# Altium schematic symbol library Capacitor - Aluminium TH.SchLib: 4591 symbols (part 1 of 27) (continued)
## 10YXG2200MEFC12.5X20 (continued)
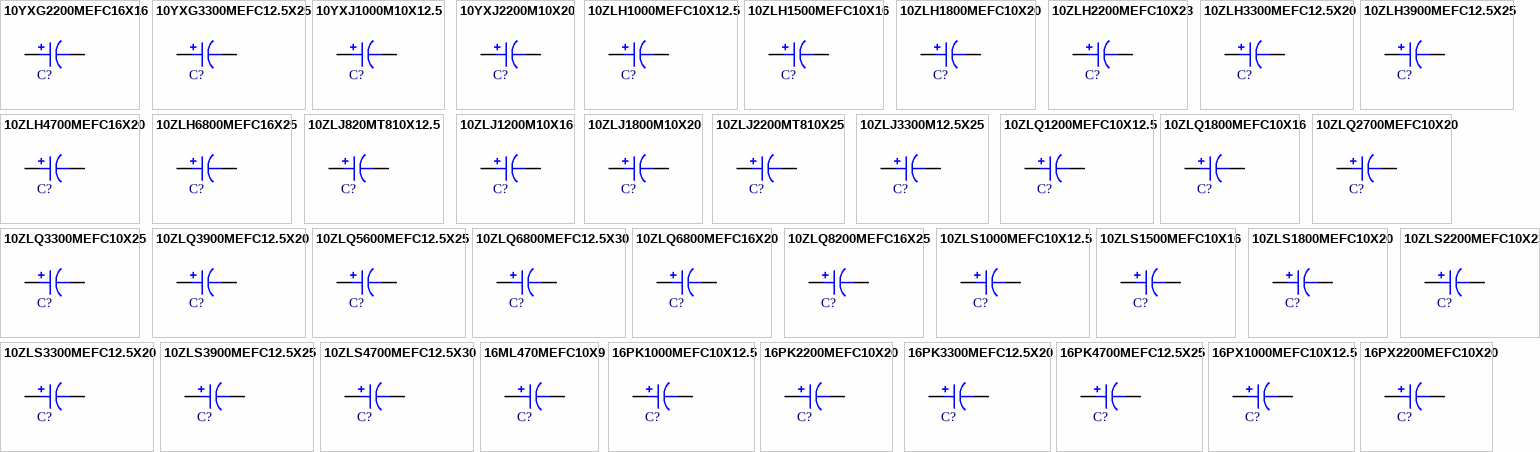
[diagram p1: symbols 10YXG2200MEFC16X16 to 16PX2200MEFC10X20]

## 10YXG2200MEFC16X16
designator C?, comment 2200uF  (value not drawn)
CAP ALUM 2200UF 20% 10V RADIAL; Part Number: 10YXG2200MEFC16X16; Manufacturer: Rubycon; TemperatureRange: -40C ~ 105C; Type: Polar; Ripple Current: 1.358A @ 120Hz; Impedance: 42 mOhm; Value: 2200uF; PartId: 26285; Supplier 1: Digi-Key; Supplier Part Number 1: 1189-1062-ND; ComponentLink1Description: Datasheet; ComponentLink1URL: http://www.rubycon.co.jp/en/catalog/e_pdfs/aluminum/e_yxg.pdf; ComponentLink2Description: Digi-Key Listing; ComponentLink2URL: https://www.digikey.com/product-detail/en/rubycon/10YXG2200MEFC16X16/1189-1062-ND/3133999; Tolerance: 20%; Voltage: 10V; Price: 1.01; Device Package: Radial, Can, 16mm
footprint CAP AL TH D16 L7.5 H20
pins: 1, 2

## 10YXG3300MEFC12.5X25
designator C?, comment 3300uF  (value not drawn)
CAP ALUM 3300UF 20% 10V RADIAL; Part Number: 10YXG3300MEFC12.5X25; Manufacturer: Rubycon; TemperatureRange: -40C ~ 105C; Type: Polar; Ripple Current: 1.561A @ 120Hz; Impedance: 27 mOhm; Value: 3300uF; PartId: 23909; Supplier 1: Digi-Key; Supplier Part Number 1: 1189-1714-ND; ComponentLink1Description: Datasheet; ComponentLink1URL: http://www.rubycon.co.jp/en/catalog/e_pdfs/aluminum/e_yxg.pdf; ComponentLink2Description: Digi-Key Listing; ComponentLink2URL: https://www.digikey.com/product-detail/en/rubycon/10YXG3300MEFC12.5X25/1189-1714-ND/3564118; Tolerance: 20%; Voltage: 10V; Price: 0.91; Device Package: Radial, Can, 12.5mm
footprint CAP AL TH D12.5 L5 H27
pins: 1, 2

## 10YXJ1000M10X12.5
designator C?, comment 1000uF  (value not drawn)
CAP ALUM 1000UF 20% 10V RADIAL; Part Number: 10YXJ1000M10X12.5; Manufacturer: Rubycon; TemperatureRange: -40C ~ 105C; Type: Polar; Ripple Current: 865mA; Impedance: 80 mOhm; Value: 1000uF; PartId: 24938; Supplier 1: Digi-Key; Supplier Part Number 1: 1189-1067-ND; ComponentLink1Description: Datasheet; ComponentLink1URL: http://www.rubycon.co.jp/en/catalog/e_pdfs/aluminum/e_yxj.pdf; ComponentLink2Description: Digi-Key Listing; ComponentLink2URL: https://www.digikey.com/product-detail/en/rubycon/10YXJ1000M10X12.5/1189-1067-ND/3134007; Tolerance: 20%; Voltage: 10V; Price: 0.51; Device Package: Radial, Can, 10mm
footprint CAP AL TH D10 L5 H14.5
pins: 1, 2

## 10YXJ2200M10X20
designator C?, comment 2200uF  (value not drawn)
CAP ALUM 2200UF 20% 10V RADIAL; Part Number: 10YXJ2200M10X20; Manufacturer: Rubycon; TemperatureRange: -40C ~ 105C; Type: Polar; Ripple Current: 1.4A; Impedance: 46 mOhm; Value: 2200uF; PartId: 25839; Supplier 1: Digi-Key; Supplier Part Number 1: 1189-1068-ND; ComponentLink1Description: Datasheet; ComponentLink1URL: http://www.rubycon.co.jp/en/catalog/e_pdfs/aluminum/e_yxj.pdf; ComponentLink2Description: Digi-Key Listing; ComponentLink2URL: https://www.digikey.com/product-detail/en/rubycon/10YXJ2200M10X20/1189-1068-ND/3134009; Tolerance: 20%; Voltage: 10V; Price: 0.48; Device Package: Radial, Can, 10mm
footprint CAP AL TH D10 L5 H22
pins: 1, 2

## 10ZLH1000MEFC10X12.5
designator C?, comment 1000uF  (value not drawn)
CAP ALUM 1000UF 20% 10V RADIAL; Part Number: 10ZLH1000MEFC10X12.5; Manufacturer: Rubycon; TemperatureRange: -40C ~ 105C; Type: Polar; Ripple Current: 798mA; Impedance: 39 mOhm; Value: 1000uF; PartId: 24901; Supplier 1: Digi-Key; Supplier Part Number 1: 1189-1072-ND; ComponentLink1Description: Datasheet; ComponentLink1URL: http://www.rubycon.co.jp/en/catalog/e_pdfs/aluminum/e_zlh.pdf; ComponentLink2Description: Digi-Key Listing; ComponentLink2URL: https://www.digikey.com/product-detail/en/rubycon/10ZLH1000MEFC10X12.5/1189-1072-ND/3134015; Tolerance: 20%; Voltage: 10V; Price: 0.49; Device Package: Radial, Can, 10mm
footprint CAP AL TH D10 L5 H14.5
pins: 1, 2

## 10ZLH1500MEFC10X16
designator C?, comment 1500uF  (value not drawn)
CAP ALUM 1500UF 20% 10V RADIAL; Part Number: 10ZLH1500MEFC10X16; Manufacturer: Rubycon; TemperatureRange: -40C ~ 105C; Type: Polar; Ripple Current: 1.056A; Impedance: 28 mOhm; Value: 1500uF; PartId: 25279; Supplier 1: Digi-Key; Supplier Part Number 1: 1189-1074-ND; ComponentLink1Description: Datasheet; ComponentLink1URL: http://www.rubycon.co.jp/en/catalog/e_pdfs/aluminum/e_zlh.pdf; ComponentLink2Description: Digi-Key Listing; ComponentLink2URL: https://www.digikey.com/product-detail/en/rubycon/10ZLH1500MEFC10X16/1189-1074-ND/3134018; Tolerance: 20%; Voltage: 10V; Price: 0.62; Device Package: Radial, Can, 10mm
footprint CAP AL TH D10 L5 H17.5
pins: 1, 2

## 10ZLH1800MEFC10X20
designator C?, comment 1800uF  (value not drawn)
CAP ALUM 1800UF 20% 10V RADIAL; Part Number: 10ZLH1800MEFC10X20; Manufacturer: Rubycon; TemperatureRange: -40C ~ 105C; Type: Polar; Ripple Current: 1.176A; Impedance: 20 mOhm; Value: 1800uF; PartId: 25915; Supplier 1: Digi-Key; Supplier Part Number 1: 1189-2951-ND; ComponentLink1Description: Datasheet; ComponentLink1URL: http://www.rubycon.co.jp/en/catalog/e_pdfs/aluminum/e_zlh.pdf; ComponentLink2Description: Digi-Key Listing; ComponentLink2URL: https://www.digikey.com/product-detail/en/rubycon/10ZLH1800MEFC10X20/1189-2951-ND/3563822; Tolerance: 20%; Voltage: 10V; Price: 0.7; Device Package: Radial, Can, 10mm
footprint CAP AL TH D10 L5 H22
pins: 1, 2

## 10ZLH2200MEFC10X23
designator C?, comment 2200uF  (value not drawn)
CAP ALUM 2200UF 20% 10V RADIAL; Part Number: 10ZLH2200MEFC10X23; Manufacturer: Rubycon; TemperatureRange: -40C ~ 105C; Type: Polar; Ripple Current: 1.575A; Impedance: 18 mOhm; Value: 2200uF; PartId: 26129; Supplier 1: Digi-Key; Supplier Part Number 1: 1189-2172-ND; ComponentLink1Description: Datasheet; ComponentLink1URL: http://www.rubycon.co.jp/en/catalog/e_pdfs/aluminum/e_zlh.pdf; ComponentLink2Description: Digi-Key Listing; ComponentLink2URL: https://www.digikey.com/product-detail/en/rubycon/10ZLH2200MEFC10X23/1189-2172-ND/3563866; Tolerance: 20%; Voltage: 10V; Price: 0.8; Device Package: Radial, Can, 10mm
footprint CAP AL TH D10 L5 H30
pins: 1, 2

## 10ZLH3300MEFC12.5X20
designator C?, comment 3300uF  (value not drawn)
CAP ALUM 3300UF 20% 10V RADIAL; Part Number: 10ZLH3300MEFC12.5X20; Manufacturer: Rubycon; TemperatureRange: -40C ~ 105C; Type: Polar; Ripple Current: 1.736A; Impedance: 17 mOhm; Value: 3300uF; PartId: 23453; Supplier 1: Digi-Key; Supplier Part Number 1: 1189-2173-ND; ComponentLink1Description: Datasheet; ComponentLink1URL: http://www.rubycon.co.jp/en/catalog/e_pdfs/aluminum/e_zlh.pdf; ComponentLink2Description: Digi-Key Listing; ComponentLink2URL: https://www.digikey.com/product-detail/en/rubycon/10ZLH3300MEFC12.5X20/1189-2173-ND/3564062; Tolerance: 20%; Voltage: 10V; Price: 1.04; Device Package: Radial, Can, 12.5mm
footprint CAP AL TH D12.5 L5 H22
pins: 1, 2

## 10ZLH3900MEFC12.5X25
designator C?, comment 3900uF  (value not drawn)
CAP ALUM 3900UF 20% 10V RADIAL; Part Number: 10ZLH3900MEFC12.5X25; Manufacturer: Rubycon; TemperatureRange: -40C ~ 105C; Type: Polar; Ripple Current: 2.03A; Impedance: 15 mOhm; Value: 3900uF; PartId: 24002; Supplier 1: Digi-Key; Supplier Part Number 1: 1189-2952-ND; ComponentLink1Description: Datasheet; ComponentLink1URL: http://www.rubycon.co.jp/en/catalog/e_pdfs/aluminum/e_zlh.pdf; ComponentLink2Description: Digi-Key Listing; ComponentLink2URL: https://www.digikey.com/product-detail/en/rubycon/10ZLH3900MEFC12.5X25/1189-2952-ND/3564147; Tolerance: 20%; Voltage: 10V; Price: 1.05; Device Package: Radial, Can, 12.5mm
footprint CAP AL TH D12.5 L5 H27
pins: 1, 2

## 10ZLH4700MEFC16X20
designator C?, comment 4700uF  (value not drawn)
CAP ALUM 4700UF 20% 10V RADIAL; Part Number: 10ZLH4700MEFC16X20; Manufacturer: Rubycon; TemperatureRange: -40C ~ 105C; Type: Polar; Ripple Current: 2.275A; Impedance: 15 mOhm; Value: 4700uF; PartId: 26421; Supplier 1: Digi-Key; Supplier Part Number 1: 1189-2954-ND; ComponentLink1Description: Datasheet; ComponentLink1URL: http://www.rubycon.co.jp/en/catalog/e_pdfs/aluminum/e_zlh.pdf; ComponentLink2Description: Digi-Key Listing; ComponentLink2URL: https://www.digikey.com/product-detail/en/rubycon/10ZLH4700MEFC16X20/1189-2954-ND/3564405; Tolerance: 20%; Voltage: 10V; Price: 1.24; Device Package: Radial, Can, 16mm
footprint CAP AL TH D16 L7.5 H22
pins: 1, 2

## 10ZLH6800MEFC16X25
designator C?, comment 6800uF  (value not drawn)
CAP ALUM 6800UF 20% 10V RADIAL; Part Number: 10ZLH6800MEFC16X25; Manufacturer: Rubycon; TemperatureRange: -40C ~ 105C; Type: Polar; Ripple Current: 2.541A; Impedance: 13 mOhm; Value: 6800uF; PartId: 26892; Supplier 1: Digi-Key; Supplier Part Number 1: 1189-2956-ND; ComponentLink1Description: Datasheet; ComponentLink1URL: http://www.rubycon.co.jp/en/catalog/e_pdfs/aluminum/e_zlh.pdf; ComponentLink2Description: Digi-Key Listing; ComponentLink2URL: https://www.digikey.com/product-detail/en/rubycon/10ZLH6800MEFC16X25/1189-2956-ND/3564489; Tolerance: 20%; Voltage: 10V; Price: 1.4; Device Package: Radial, Can, 16mm
footprint CAP AL TH D16 L7.5 H27
pins: 1, 2

## 10ZLJ820MT810X12.5
designator C?, comment 820uF  (value not drawn)
CAP ALUM 820UF 20% 10V RADIAL; Part Number: 10ZLJ820MT810X12.5; Manufacturer: Rubycon; TemperatureRange: -40C ~ 105C; Type: Polar; Ripple Current: 1.02A @ 120Hz; Impedance: 53 mOhm; Value: 820uF; PartId: 24601; Supplier 1: Digi-Key; Supplier Part Number 1: 1189-1530-2-ND; ComponentLink1Description: Datasheet; ComponentLink1URL: http://www.rubycon.co.jp/en/catalog/e_pdfs/aluminum/e_zlj.pdf; ComponentLink2Description: Digi-Key Listing; ComponentLink2URL: https://www.digikey.com/product-detail/en/rubycon/10ZLJ820MT810X12.5/1189-1530-2-ND/3134810; Tolerance: 20%; Voltage: 10V; Price: 0.1772; Device Package: Radial, Can, 10mm
footprint CAP AL TH D10 L5 H14.5
pins: 1, 2

## 10ZLJ1200M10X16
designator C?, comment 1200uF  (value not drawn)
CAP ALUM 1200UF 20% 10V RADIAL; Part Number: 10ZLJ1200M10X16; Manufacturer: Rubycon; TemperatureRange: -40C ~ 105C; Type: Polar; Ripple Current: 1.2A @ 120Hz; Impedance: 38 mOhm; Value: 1200uF; PartId: 25350; Supplier 1: Digi-Key; Supplier Part Number 1: 1189-1077-ND; ComponentLink1Description: Datasheet; ComponentLink1URL: http://www.rubycon.co.jp/en/catalog/e_pdfs/aluminum/e_zlj.pdf; ComponentLink2Description: Digi-Key Listing; ComponentLink2URL: https://www.digikey.com/product-detail/en/rubycon/10ZLJ1200M10X16/1189-1077-ND/3134023; Tolerance: 20%; Voltage: 10V; Price: 0.68; Device Package: Radial, Can, 10mm
footprint CAP AL TH D10 L5 H17.5
pins: 1, 2

## 10ZLJ1800M10X20
designator C?, comment 1800uF  (value not drawn)
CAP ALUM 1800UF 20% 10V RADIAL; Part Number: 10ZLJ1800M10X20; Manufacturer: Rubycon; TemperatureRange: -40C ~ 105C; Type: Polar; Ripple Current: 1.5A @ 120Hz; Impedance: 28 mOhm; Value: 1800uF; PartId: 25930; Supplier 1: Digi-Key; Supplier Part Number 1: 1189-2175-ND; ComponentLink1Description: Datasheet; ComponentLink1URL: http://www.rubycon.co.jp/en/catalog/e_pdfs/aluminum/e_zlj.pdf; ComponentLink2Description: Digi-Key Listing; ComponentLink2URL: https://www.digikey.com/product-detail/en/rubycon/10ZLJ1800M10X20/1189-2175-ND/3563826; Tolerance: 20%; Voltage: 10V; Price: 0.73; Device Package: Radial, Can, 10mm
footprint CAP AL TH D10 L5 H22
pins: 1, 2

## 10ZLJ2200MT810X25
designator C?, comment 2200uF  (value not drawn)
CAP ALUM 2200UF 20% 10V RADIAL; Part Number: 10ZLJ2200MT810X25; Manufacturer: Rubycon; TemperatureRange: -40C ~ 105C; Type: Polar; Ripple Current: 2.03A @ 120Hz; Impedance: 24 mOhm; Value: 2200uF; PartId: 26015; Supplier 1: Digi-Key; Supplier Part Number 1: 1189-1529-3-ND; ComponentLink1Description: Datasheet; ComponentLink1URL: http://www.rubycon.co.jp/en/catalog/e_pdfs/aluminum/e_zlj.pdf; ComponentLink2Description: Digi-Key Listing; ComponentLink2URL: https://www.digikey.com/product-detail/en/rubycon/10ZLJ2200MT810X25/1189-1529-3-ND/3134809; Tolerance: 20%; Voltage: 10V; Price: 0.3085; Device Package: Radial, Can, 10mm
footprint CAP AL TH D10 L5 H30
pins: 1, 2

## 10ZLJ3300M12.5X25
designator C?, comment 3300uF  (value not drawn)
CAP ALUM 3300UF 20% 10V RADIAL; Part Number: 10ZLJ3300M12.5X25; Manufacturer: Rubycon; TemperatureRange: -40C ~ 105C; Type: Polar; Ripple Current: 2.24A @ 120Hz; Impedance: 19 mOhm; Value: 3300uF; PartId: 24046; Supplier 1: Digi-Key; Supplier Part Number 1: 1189-2176-ND; ComponentLink1Description: Datasheet; ComponentLink1URL: http://www.rubycon.co.jp/en/catalog/e_pdfs/aluminum/e_zlj.pdf; ComponentLink2Description: Digi-Key Listing; ComponentLink2URL: https://www.digikey.com/product-detail/en/rubycon/10ZLJ3300M12.5X25/1189-2176-ND/3564154; Tolerance: 20%; Voltage: 10V; Price: 1.14; Device Package: Radial, Can, 12.5mm
footprint CAP AL TH D12.5 L5 H27
pins: 1, 2

## 10ZLQ1200MEFC10X12.5
designator C?, comment 1200uF  (value not drawn)
CAP ALUM 1200UF 20% 10V T/H; Part Number: 10ZLQ1200MEFC10X12.5; Manufacturer: Rubycon; TemperatureRange: -40C ~ 105C; Type: Polar; Ripple Current: 882mA @ 120Hz; Impedance: 35 mOhm; Value: 1200uF; PartId: 24980; Supplier 1: Digi-Key; Supplier Part Number 1: 1189-3615-ND; ComponentLink1Description: Datasheet; ComponentLink1URL: http://www.rubycon.co.jp/en/catalog/e_pdfs/aluminum/e_ZLQ.pdf; ComponentLink2Description: Digi-Key Listing; ComponentLink2URL: https://www.digikey.com/product-detail/en/rubycon/10ZLQ1200MEFC10X12.5/1189-3615-ND/6049862; Tolerance: 20%; Voltage: 10V; Price: 0.54; Device Package: Radial, Can, 10mm
footprint CAP AL TH D10 L5 H14.5
pins: 1, 2

## 10ZLQ1800MEFC10X16
designator C?, comment 1800uF  (value not drawn)
CAP ALUM 1800UF 20% 10V T/H; Part Number: 10ZLQ1800MEFC10X16; Manufacturer: Rubycon; TemperatureRange: -40C ~ 105C; Type: Polar; Ripple Current: 1.158A @ 120Hz; Impedance: 25 mOhm; Value: 1800uF; PartId: 25444; Supplier 1: Digi-Key; Supplier Part Number 1: 1189-3617-ND; ComponentLink1Description: Datasheet; ComponentLink1URL: http://www.rubycon.co.jp/en/catalog/e_pdfs/aluminum/e_ZLQ.pdf; ComponentLink2Description: Digi-Key Listing; ComponentLink2URL: https://www.digikey.com/product-detail/en/rubycon/10ZLQ1800MEFC10X16/1189-3617-ND/6049864; Tolerance: 20%; Voltage: 10V; Price: 0.66; Device Package: Radial, Can, 10mm
footprint CAP AL TH D10 L5 H17.5
pins: 1, 2

## 10ZLQ2700MEFC10X20
designator C?, comment 2700uF  (value not drawn)
CAP ALUM 2700UF 20% 10V T/H; Part Number: 10ZLQ2700MEFC10X20; Manufacturer: Rubycon; TemperatureRange: -40C ~ 105C; Type: Polar; Ripple Current: 1.491A @ 120Hz; Impedance: 18 mOhm; Value: 2700uF; PartId: 25897; Supplier 1: Digi-Key; Supplier Part Number 1: 1189-3618-ND; ComponentLink1Description: Datasheet; ComponentLink1URL: http://www.rubycon.co.jp/en/catalog/e_pdfs/aluminum/e_ZLQ.pdf; ComponentLink2Description: Digi-Key Listing; ComponentLink2URL: https://www.digikey.com/product-detail/en/rubycon/10ZLQ2700MEFC10X20/1189-3618-ND/6049865; Tolerance: 20%; Voltage: 10V; Price: 0.67; Device Package: Radial, Can, 10mm
footprint CAP AL TH D10 L5 H22
pins: 1, 2

## 10ZLQ3300MEFC10X25
designator C?, comment 3300uF  (value not drawn)
CAP ALUM 3300UF 20% 10V T/H; Part Number: 10ZLQ3300MEFC10X25; Manufacturer: Rubycon; TemperatureRange: -40C ~ 105C; Type: Polar; Ripple Current: 1.75A @ 120Hz; Impedance: 15 mOhm; Value: 3300uF; PartId: 26149; Supplier 1: Digi-Key; Supplier Part Number 1: 1189-3619-ND; ComponentLink1Description: Datasheet; ComponentLink1URL: http://www.rubycon.co.jp/en/catalog/e_pdfs/aluminum/e_ZLQ.pdf; ComponentLink2Description: Digi-Key Listing; ComponentLink2URL: https://www.digikey.com/product-detail/en/rubycon/10ZLQ3300MEFC10X25/1189-3619-ND/6049998; Tolerance: 20%; Voltage: 10V; Price: 0.84; Device Package: Radial, Can, 10mm
footprint CAP AL TH D10 L5 H30
pins: 1, 2

## 10ZLQ3900MEFC12.5X20
designator C?, comment 3900uF  (value not drawn)
CAP ALUM 3900UF 20% 10V T/H; Part Number: 10ZLQ3900MEFC12.5X20; Manufacturer: Rubycon; TemperatureRange: -40C ~ 105C; Type: Polar; Ripple Current: 1.883A @ 120Hz; Impedance: 16 mOhm; Value: 3900uF; PartId: 23399; Supplier 1: Digi-Key; Supplier Part Number 1: 1189-3620-ND; ComponentLink1Description: Datasheet; ComponentLink1URL: http://www.rubycon.co.jp/en/catalog/e_pdfs/aluminum/e_ZLQ.pdf; ComponentLink2Description: Digi-Key Listing; ComponentLink2URL: https://www.digikey.com/product-detail/en/rubycon/10ZLQ3900MEFC12.5X20/1189-3620-ND/6049999; Tolerance: 20%; Voltage: 10V; Price: 0.97; Device Package: Radial, Can, 12.5mm
footprint CAP AL TH D12.5 L5 H22
pins: 1, 2

## 10ZLQ5600MEFC12.5X25
designator C?, comment 5600uF  (value not drawn)
CAP ALUM 5600UF 20% 10V T/H; Part Number: 10ZLQ5600MEFC12.5X25; Manufacturer: Rubycon; TemperatureRange: -40C ~ 105C; Type: Polar; Ripple Current: 2.198A @ 120Hz; Impedance: 13 mOhm; Value: 5600uF; PartId: 23995; Supplier 1: Digi-Key; Supplier Part Number 1: 1189-3621-ND; ComponentLink1Description: Datasheet; ComponentLink1URL: http://www.rubycon.co.jp/en/catalog/e_pdfs/aluminum/e_ZLQ.pdf; ComponentLink2Description: Digi-Key Listing; ComponentLink2URL: https://www.digikey.com/product-detail/en/rubycon/10ZLQ5600MEFC12.5X25/1189-3621-ND/6050000; Tolerance: 20%; Voltage: 10V; Price: 1.04; Device Package: Radial, Can, 12.5mm
footprint CAP AL TH D12.5 L5 H27
pins: 1, 2

## 10ZLQ6800MEFC12.5X30
designator C?, comment 6800uF  (value not drawn)
CAP ALUM 6800UF 20% 10V T/H; Part Number: 10ZLQ6800MEFC12.5X30; Manufacturer: Rubycon; TemperatureRange: -40C ~ 105C; Type: Polar; Ripple Current: 2.576A @ 120Hz; Impedance: 12 mOhm; Value: 6800uF; PartId: 24333; Supplier 1: Digi-Key; Supplier Part Number 1: 1189-3622-ND; ComponentLink1Description: Datasheet; ComponentLink1URL: http://www.rubycon.co.jp/en/catalog/e_pdfs/aluminum/e_ZLQ.pdf; ComponentLink2Description: Digi-Key Listing; ComponentLink2URL: https://www.digikey.com/product-detail/en/rubycon/10ZLQ6800MEFC12.5X30/1189-3622-ND/6050001; Tolerance: 20%; Voltage: 10V; Price: 1.3; Device Package: Radial, Can, 12.5mm
footprint CAP AL TH D12.5 L5 H35.5
pins: 1, 2

## 10ZLQ6800MEFC16X20
designator C?, comment 6800uF  (value not drawn)
CAP ALUM 6800UF 20% 10V T/H; Part Number: 10ZLQ6800MEFC16X20; Manufacturer: Rubycon; TemperatureRange: -40C ~ 105C; Type: Polar; Ripple Current: 2.45A @ 120Hz; Impedance: 14 mOhm; Value: 6800uF; PartId: 26444; Supplier 1: Digi-Key; Supplier Part Number 1: 1189-3623-ND; ComponentLink1Description: Datasheet; ComponentLink1URL: http://www.rubycon.co.jp/en/catalog/e_pdfs/aluminum/e_ZLQ.pdf; ComponentLink2Description: Digi-Key Listing; ComponentLink2URL: https://www.digikey.com/product-detail/en/rubycon/10ZLQ6800MEFC16X20/1189-3623-ND/6050185; Tolerance: 20%; Voltage: 10V; Price: 1.43; Device Package: Radial, Can, 16mm
footprint CAP AL TH D16 L7.5 H22
pins: 1, 2

## 10ZLQ8200MEFC16X25
designator C?, comment 8200uF  (value not drawn)
CAP ALUM 8200UF 20% 10V T/H; Part Number: 10ZLQ8200MEFC16X25; Manufacturer: Rubycon; TemperatureRange: -40C ~ 105C; Type: Polar; Ripple Current: 2.716A @ 120Hz; Impedance: 11 mOhm; Value: 8200uF; PartId: 26899; Supplier 1: Digi-Key; Supplier Part Number 1: 1189-3625-ND; ComponentLink1Description: Datasheet; ComponentLink1URL: http://www.rubycon.co.jp/en/catalog/e_pdfs/aluminum/e_ZLQ.pdf; ComponentLink2Description: Digi-Key Listing; ComponentLink2URL: https://www.digikey.com/product-detail/en/rubycon/10ZLQ8200MEFC16X25/1189-3625-ND/6050186; Tolerance: 20%; Voltage: 10V; Price: 1.53; Device Package: Radial, Can, 16mm
footprint CAP AL TH D16 L7.5 H27
pins: 1, 2

## 10ZLS1000MEFC10X12.5
designator C?, comment 1000uF  (value not drawn)
CAP ALUM 1000UF 20% 10V RADIAL; Part Number: 10ZLS1000MEFC10X12.5; Manufacturer: Rubycon; TemperatureRange: -40C ~ 105C; Type: Polar; Ripple Current: 744mA; Impedance: 45 mOhm; Value: 1000uF; PartId: 24966; Supplier 1: Digi-Key; Supplier Part Number 1: 1189-2561-ND; ComponentLink1Description: Datasheet; ComponentLink1URL: http://www.rubycon.co.jp/en/catalog/e_pdfs/aluminum/e_zls.pdf; ComponentLink2Description: Digi-Key Listing; ComponentLink2URL: https://www.digikey.com/product-detail/en/rubycon/10ZLS1000MEFC10X12.5/1189-2561-ND/4977108; Tolerance: 20%; Voltage: 10V; Price: 0.53; Device Package: Radial, Can, 10mm
footprint CAP AL TH D10 L5 H14.5
pins: 1, 2

## 10ZLS1500MEFC10X16
designator C?, comment 1500uF  (value not drawn)
CAP ALUM 1500UF 20% 10V RADIAL; Part Number: 10ZLS1500MEFC10X16; Manufacturer: Rubycon; TemperatureRange: -40C ~ 105C; Type: Polar; Ripple Current: 990mA; Impedance: 32 mOhm; Value: 1500uF; PartId: 25282; Supplier 1: Digi-Key; Supplier Part Number 1: 1189-2563-ND; ComponentLink1Description: Datasheet; ComponentLink1URL: http://www.rubycon.co.jp/en/catalog/e_pdfs/aluminum/e_zls.pdf; ComponentLink2Description: Digi-Key Listing; ComponentLink2URL: https://www.digikey.com/product-detail/en/rubycon/10ZLS1500MEFC10X16/1189-2563-ND/4977110; Tolerance: 20%; Voltage: 10V; Price: 0.62; Device Package: Radial, Can, 10mm
footprint CAP AL TH D10 L5 H17.5
pins: 1, 2

## 10ZLS1800MEFC10X20
designator C?, comment 1800uF  (value not drawn)
CAP ALUM 1800UF 20% 10V RADIAL; Part Number: 10ZLS1800MEFC10X20; Manufacturer: Rubycon; TemperatureRange: -40C ~ 105C; Type: Polar; Ripple Current: 1.176A; Impedance: 20 mOhm; Value: 1800uF; PartId: 25900; Supplier 1: Digi-Key; Supplier Part Number 1: 1189-2564-ND; ComponentLink1Description: Datasheet; ComponentLink1URL: http://www.rubycon.co.jp/en/catalog/e_pdfs/aluminum/e_zls.pdf; ComponentLink2Description: Digi-Key Listing; ComponentLink2URL: https://www.digikey.com/product-detail/en/rubycon/10ZLS1800MEFC10X20/1189-2564-ND/4977111; Tolerance: 20%; Voltage: 10V; Price: 0.68; Device Package: Radial, Can, 10mm
footprint CAP AL TH D10 L5 H22
pins: 1, 2

## 10ZLS2200MEFC10X23
designator C?, comment 2200uF  (value not drawn)
CAP ALUM 2200UF 20% 10V RADIAL; Part Number: 10ZLS2200MEFC10X23; Manufacturer: Rubycon; TemperatureRange: -40C ~ 105C; Type: Polar; Ripple Current: 1.575A; Impedance: 18 mOhm; Value: 2200uF; PartId: 26073; Supplier 1: Digi-Key; Supplier Part Number 1: 1189-2565-ND; ComponentLink1Description: Datasheet; ComponentLink1URL: http://www.rubycon.co.jp/en/catalog/e_pdfs/aluminum/e_zls.pdf; ComponentLink2Description: Digi-Key Listing; ComponentLink2URL: https://www.digikey.com/product-detail/en/rubycon/10ZLS2200MEFC10X23/1189-2565-ND/4977112; Tolerance: 20%; Voltage: 10V; Price: 0.7; Device Package: Radial, Can, 10mm
footprint CAP AL TH D10 L5 H30
pins: 1, 2

## 10ZLS3300MEFC12.5X20
designator C?, comment 3300uF  (value not drawn)
CAP ALUM 3300UF 20% 10V RADIAL; Part Number: 10ZLS3300MEFC12.5X20; Manufacturer: Rubycon; TemperatureRange: -40C ~ 105C; Type: Polar; Ripple Current: 1.736A; Impedance: 17 mOhm; Value: 3300uF; PartId: 23369; Supplier 1: Digi-Key; Supplier Part Number 1: 1189-2566-ND; ComponentLink1Description: Datasheet; ComponentLink1URL: http://www.rubycon.co.jp/en/catalog/e_pdfs/aluminum/e_zls.pdf; ComponentLink2Description: Digi-Key Listing; ComponentLink2URL: https://www.digikey.com/product-detail/en/rubycon/10ZLS3300MEFC12.5X20/1189-2566-ND/4977113; Tolerance: 20%; Voltage: 10V; Price: 0.89; Device Package: Radial, Can, 12.5mm
footprint CAP AL TH D12.5 L5 H22
pins: 1, 2

## 10ZLS3900MEFC12.5X25
designator C?, comment 3900uF  (value not drawn)
CAP ALUM 3900UF 20% 10V RADIAL; Part Number: 10ZLS3900MEFC12.5X25; Manufacturer: Rubycon; TemperatureRange: -40C ~ 105C; Type: Polar; Ripple Current: 2.03A; Impedance: 15 mOhm; Value: 3900uF; PartId: 23969; Supplier 1: Digi-Key; Supplier Part Number 1: 1189-2567-ND; ComponentLink1Description: Datasheet; ComponentLink1URL: http://www.rubycon.co.jp/en/catalog/e_pdfs/aluminum/e_zls.pdf; ComponentLink2Description: Digi-Key Listing; ComponentLink2URL: https://www.digikey.com/product-detail/en/rubycon/10ZLS3900MEFC12.5X25/1189-2567-ND/4977114; Tolerance: 20%; Voltage: 10V; Price: 1; Device Package: Radial, Can, 12.5mm
footprint CAP AL TH D12.5 L5 H27
pins: 1, 2

## 10ZLS4700MEFC12.5X30
designator C?, comment 4700uF  (value not drawn)
CAP ALUM 4700UF 20% 10V RADIAL; Part Number: 10ZLS4700MEFC12.5X30; Manufacturer: Rubycon; TemperatureRange: -40C ~ 105C; Type: Polar; Ripple Current: 2.415A; Impedance: 13 mOhm; Value: 4700uF; PartId: 24293; Supplier 1: Digi-Key; Supplier Part Number 1: 1189-2568-ND; ComponentLink1Description: Datasheet; ComponentLink1URL: http://www.rubycon.co.jp/en/catalog/e_pdfs/aluminum/e_zls.pdf; ComponentLink2Description: Digi-Key Listing; ComponentLink2URL: https://www.digikey.com/product-detail/en/rubycon/10ZLS4700MEFC12.5X30/1189-2568-ND/4977115; Tolerance: 20%; Voltage: 10V; Price: 1.13; Device Package: Radial, Can, 12.5mm
footprint CAP AL TH D12.5 L5 H35.5
pins: 1, 2

## 16ML470MEFC10X9
designator C?, comment 470uF  (value not drawn)
CAP ALUM 470UF 20% 16V RADIAL; Part Number: 16ML470MEFC10X9; Manufacturer: Rubycon; TemperatureRange: -40C ~ 105C; Type: Polar; Ripple Current: 460mA @ 120Hz; Value: 470uF; PartId: 24459; Supplier 1: Digi-Key; Supplier Part Number 1: 1189-3678-ND; ComponentLink1Description: Datasheet; ComponentLink1URL: http://www.rubycon.co.jp/en/catalog/e_pdfs/aluminum/e_ml.pdf; ComponentLink2Description: Digi-Key Listing; ComponentLink2URL: https://www.digikey.com/product-detail/en/rubycon/16ML470MEFC10X9/1189-3678-ND/3563506; Tolerance: 20%; Voltage: 16V; Price: 0.51; Device Package: Radial, Can, 10mm
footprint CAP AL TH D10 L5 H12.5
pins: 1, 2

## 16PK1000MEFC10X12.5
designator C?, comment 1000uF  (value not drawn)
CAP ALUM 1000UF 20% 16V RADIAL; Part Number: 16PK1000MEFC10X12.5; Manufacturer: Rubycon; TemperatureRange: -40C ~ 85C; Ripple Current: 720mA; Value: 1000uF; PartId: 24849; Supplier 1: Digi-Key; Supplier Part Number 1: 1189-1719-ND; ComponentLink1Description: Datasheet; ComponentLink1URL: http://www.rubycon.co.jp/en/catalog/e_pdfs/aluminum/e_pk.pdf; ComponentLink2Description: Digi-Key Listing; ComponentLink2URL: https://www.digikey.com/product-detail/en/rubycon/16PK1000MEFC10X12.5/1189-1719-ND/3563556; Tolerance: 20%; Voltage: 16V; Price: 0.47; Device Package: Radial, Can, 10mm
footprint CAP AL TH D10 L5 H14.5
pins: 1, 2

## 16PK2200MEFC10X20
designator C?, comment 2200uF  (value not drawn)
CAP ALUM 2200UF 20% 16V RADIAL; Part Number: 16PK2200MEFC10X20; Manufacturer: Rubycon; TemperatureRange: -40C ~ 85C; Ripple Current: 1.32A; Value: 2200uF; PartId: 25596; Supplier 1: Digi-Key; Supplier Part Number 1: 1189-1118-ND; ComponentLink1Description: Datasheet; ComponentLink1URL: http://www.rubycon.co.jp/en/catalog/e_pdfs/aluminum/e_pk.pdf; ComponentLink2Description: Digi-Key Listing; ComponentLink2URL: https://www.digikey.com/product-detail/en/rubycon/16PK2200MEFC10X20/1189-1118-ND/3134077; Tolerance: 20%; Voltage: 16V; Price: 0.68; Device Package: Radial, Can, 10mm
footprint CAP AL TH D10 L5 H22
pins: 1, 2

## 16PK3300MEFC12.5X20
designator C?, comment 3300uF  (value not drawn)
CAP ALUM 3300UF 20% 16V RADIAL; Part Number: 16PK3300MEFC12.5X20; Manufacturer: Rubycon; TemperatureRange: -40C ~ 85C; Ripple Current: 1.6A; Value: 3300uF; PartId: 23387; Supplier 1: Digi-Key; Supplier Part Number 1: 1189-1720-ND; ComponentLink1Description: Datasheet; ComponentLink1URL: http://www.rubycon.co.jp/en/catalog/e_pdfs/aluminum/e_pk.pdf; ComponentLink2Description: Digi-Key Listing; ComponentLink2URL: https://www.digikey.com/product-detail/en/rubycon/16PK3300MEFC12.5X20/1189-1720-ND/3564005; Tolerance: 20%; Voltage: 16V; Price: 0.94; Device Package: Radial, Can, 12.5mm
footprint CAP AL TH D12.5 L5 H22
pins: 1, 2

## 16PK4700MEFC12.5X25
designator C?, comment 4700uF  (value not drawn)
CAP ALUM 4700UF 20% 16V RADIAL; Part Number: 16PK4700MEFC12.5X25; Manufacturer: Rubycon; TemperatureRange: -40C ~ 85C; Ripple Current: 2.05A; Value: 4700uF; PartId: 23671; Supplier 1: Digi-Key; Supplier Part Number 1: 1189-1123-ND; ComponentLink1Description: Datasheet; ComponentLink1URL: http://www.rubycon.co.jp/en/catalog/e_pdfs/aluminum/e_pk.pdf; ComponentLink2Description: Digi-Key Listing; ComponentLink2URL: https://www.digikey.com/product-detail/en/rubycon/16PK4700MEFC12.5X25/1189-1123-ND/3134081; Tolerance: 20%; Voltage: 16V; Price: 0.99; Device Package: Radial, Can, 12.5mm
footprint CAP AL TH D12.5 L5 H26.5
pins: 1, 2

## 16PX1000MEFC10X12.5
designator C?, comment 1000uF  (value not drawn)
CAP ALUM 1000UF 20% 16V RADIAL; Part Number: 16PX1000MEFC10X12.5; Manufacturer: Rubycon; TemperatureRange: -55C ~ 105C; Type: Polar; Ripple Current: 640mA; Value: 1000uF; PartId: 24759; Supplier 1: Digi-Key; Supplier Part Number 1: 1189-2188-ND; ComponentLink1Description: Datasheet; ComponentLink1URL: http://www.rubycon.co.jp/en/catalog/e_pdfs/aluminum/e_px.pdf; ComponentLink2Description: Digi-Key Listing; ComponentLink2URL: https://www.digikey.com/product-detail/en/rubycon/16PX1000MEFC10X12.5/1189-2188-ND/3563561; Tolerance: 20%; Voltage: 16V; Price: 0.43; Device Package: Radial, Can, 10mm
footprint CAP AL TH D10 L5 H14.5
pins: 1, 2

## 16PX2200MEFC10X20
designator C?, comment 2200uF  (value not drawn)
CAP ALUM 2200UF 20% 16V RADIAL; Part Number: 16PX2200MEFC10X20; Manufacturer: Rubycon; TemperatureRange: -55C ~ 105C; Type: Polar; Ripple Current: 1.05A; Value: 2200uF; PartId: 25581; Supplier 1: Digi-Key; Supplier Part Number 1: 1189-1128-ND; ComponentLink1Description: Datasheet; ComponentLink1URL: http://www.rubycon.co.jp/en/catalog/e_pdfs/aluminum/e_px.pdf; ComponentLink2Description: Digi-Key Listing; ComponentLink2URL: https://www.digikey.com/product-detail/en/rubycon/16PX2200MEFC10X20/1189-1128-ND/3134086; Tolerance: 20%; Voltage: 16V; Price: 0.67; Device Package: Radial, Can, 10mm
footprint CAP AL TH D10 L5 H22
pins: 1, 2

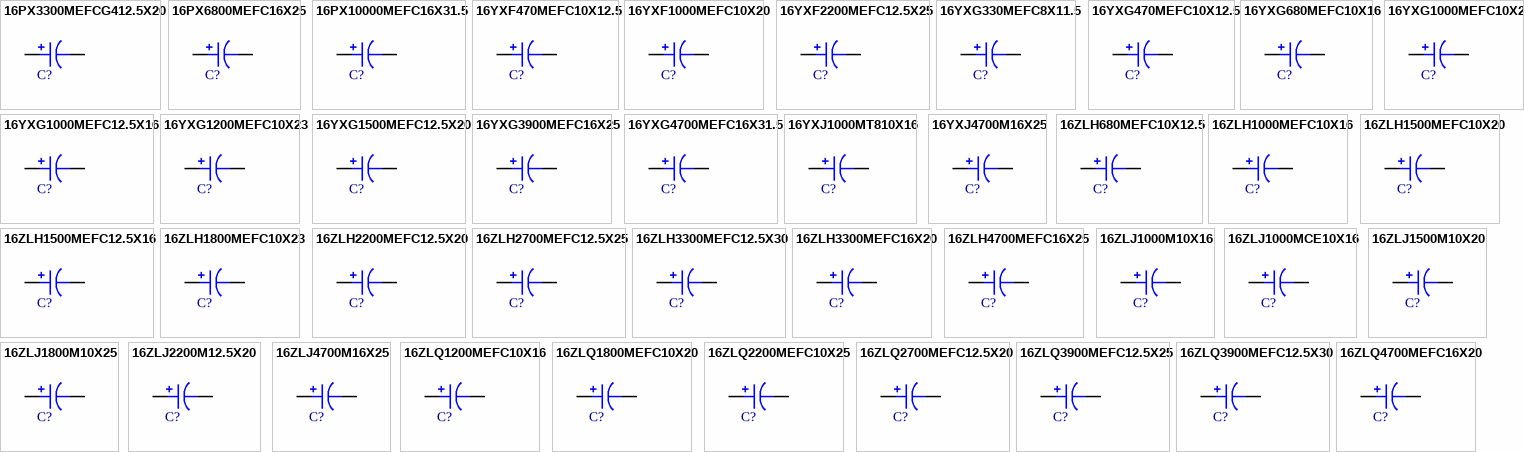
[diagram p2: symbols 16PX3300MEFCG412.5X20 to 16ZLQ4700MEFC16X20]

## 16PX3300MEFCG412.5X20
designator C?, comment 3300uF  (value not drawn)
CAP ALUM 3300UF 20% 16V RADIAL; Part Number: 16PX3300MEFCG412.5X20; Manufacturer: Rubycon; TemperatureRange: -55C ~ 105C; Type: Polar; Ripple Current: 1.3A; Value: 3300uF; PartId: 22975; Supplier 1: Digi-Key; Supplier Part Number 1: 1189-1534-1-ND; ComponentLink1Description: Datasheet; ComponentLink1URL: http://www.rubycon.co.jp/en/catalog/e_pdfs/aluminum/e_px.pdf; ComponentLink2Description: Digi-Key Listing; ComponentLink2URL: https://www.digikey.com/product-detail/en/rubycon/16PX3300MEFCG412.5X20/1189-1534-1-ND/3134490; Tolerance: 20%; Voltage: 16V; Price: 0; Device Package: Radial, Can, 12.5mm
footprint CAP AL TH D12.5 L5 H21.5
pins: 1, 2

## 16PX6800MEFC16X25
designator C?, comment 6800uF  (value not drawn)
CAP ALUM 6800UF 20% 16V RADIAL; Part Number: 16PX6800MEFC16X25; Manufacturer: Rubycon; TemperatureRange: -55C ~ 105C; Type: Polar; Ripple Current: 1.9A; Value: 6800uF; PartId: 26670; Supplier 1: Digi-Key; Supplier Part Number 1: 1189-1721-ND; ComponentLink1Description: Datasheet; ComponentLink1URL: http://www.rubycon.co.jp/en/catalog/e_pdfs/aluminum/e_px.pdf; ComponentLink2Description: Digi-Key Listing; ComponentLink2URL: https://www.digikey.com/product-detail/en/rubycon/16PX6800MEFC16X25/1189-1721-ND/3564437; Tolerance: 20%; Voltage: 16V; Price: 1.68; Device Package: Radial, Can, 16mm
footprint CAP AL TH D16 L7.5 H26.5
pins: 1, 2

## 16PX10000MEFC16X31.5
designator C?, comment 10000uF  (value not drawn)